# Altium footprint library Global Library.PcbLib: 97 footprints (part 1 of 7)
Each footprint in its own frame and in the unit in brackets; x right, y up, seen from the top. Pads: shape width x height; smd on the part's side, far side on the other; paste and mask are expansions set on the pad; w line width, h text height; cw(c..) or ccw(c..) is an arc to the next point about the centre after c.
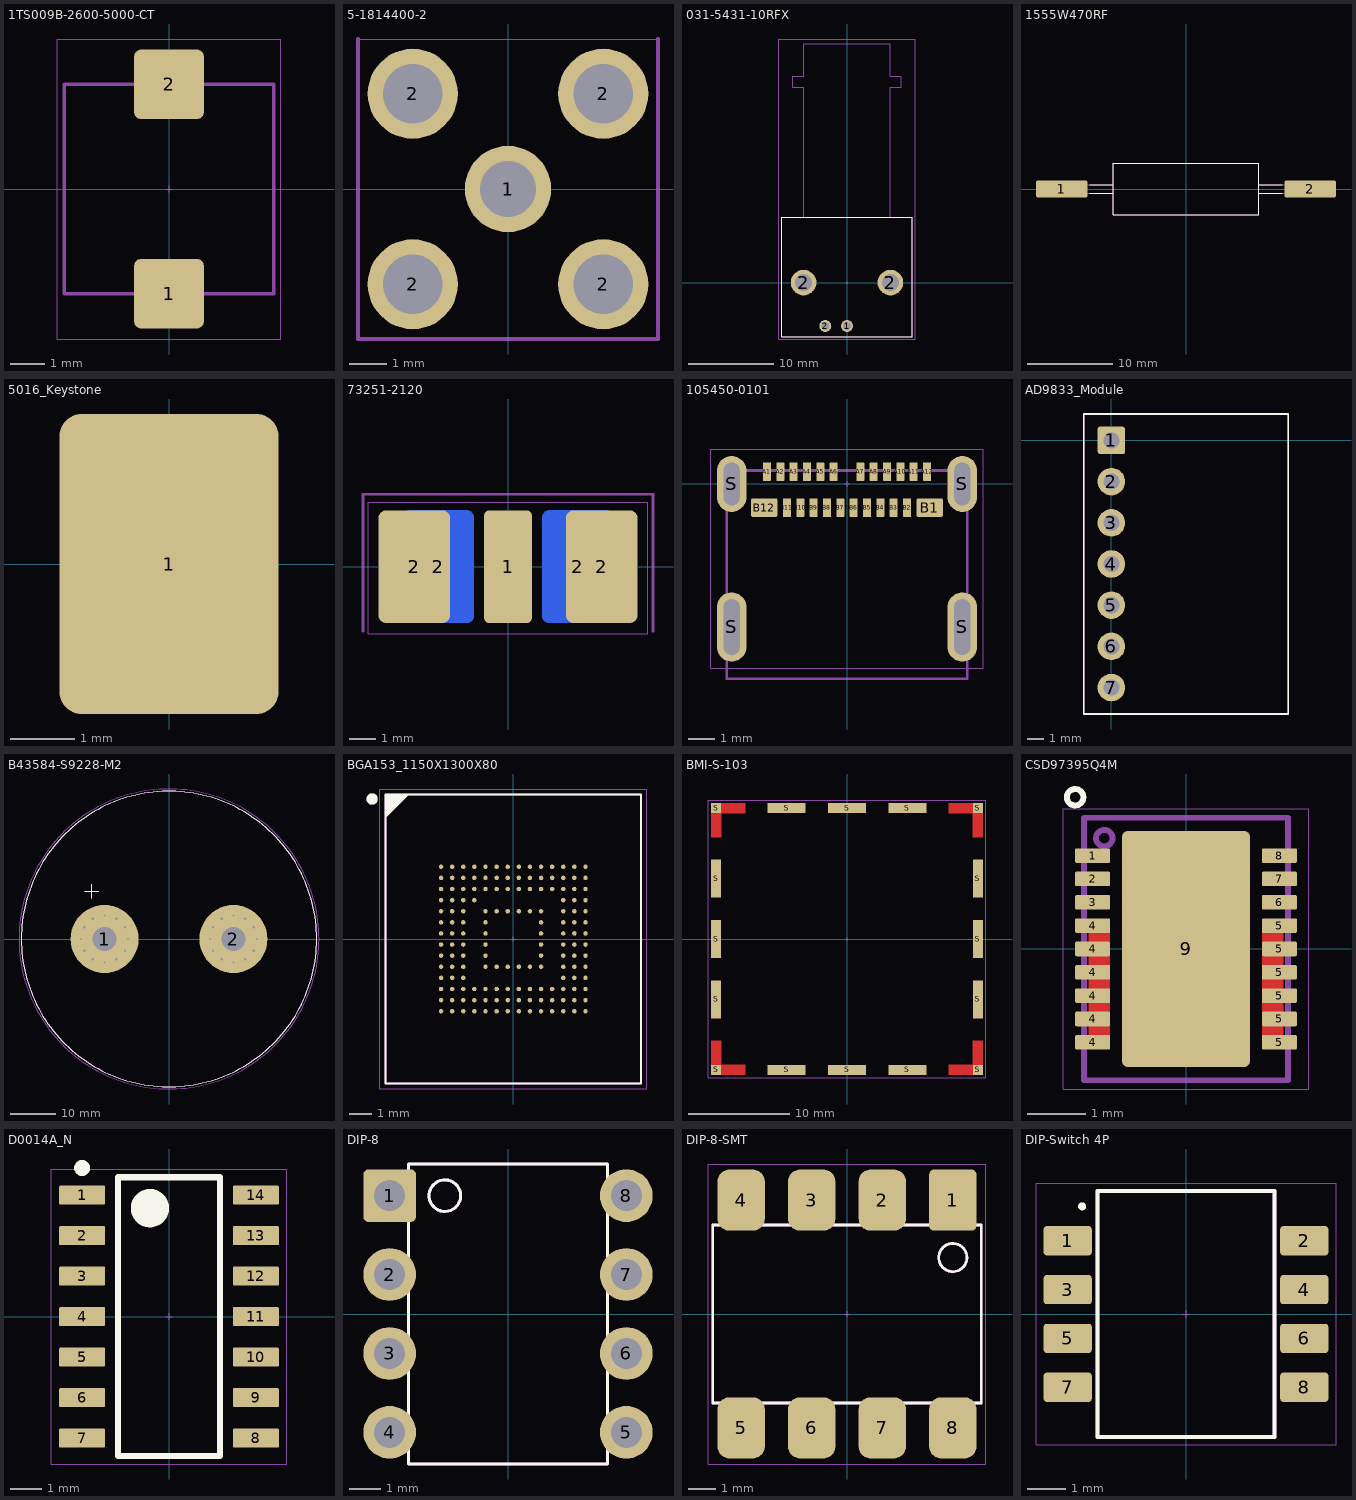
[diagram p0: the footprints below, top view; thin cyan lines are the x and y axes]

## 1TS009B-2600-5000-CT [mm] "Button Tactile 6x6"
height 5
pads (2):
  rrect20% 2x2 smd: 1(0,-3) 2(0,3)
Top Courtyard:
  lines w0.01: -0.1,0 0.1,0 ; 0,-0.1 0,0.1 ; -3.2,-4.3 -3.2,4.3 3.2,4.3 3.2,-4.3 -3.2,-4.3
Top Assembly:
  lines w0.1: -3,-3 -3,3 3,3 3,-3 -3,-3
Top Assy SMT:
  lines w0.1: -3,-3 -3,3 3,3 3,-3 -3,-3
  text ".Designator" at -3.259,-3.081 h1
3D body "1TS009B-XXX0-5000.stp": height 5, standoff 0, extent -3,-3.3 3,3.3

## 5-1814400-2 [mm] "SMA Connector"
pads (5):
  round 2.3 hole 1.5: 1(0,0)
  round 2.4 hole 1.6: 2(-2.54,-2.54) 2(-2.54,2.54) 2(2.54,-2.54) 2(2.54,2.54)
Top Courtyard:
  lines w0.01: -0.1,0 0.1,0 ; 0,-0.1 0,0.1 ; -4,-4 4,-4 4,4 -4,4 -4,-4
Top Assembly:
  lines w0.1: -4,4 -4,-4 4,-4 4,4
Top Assy SMT:
  lines w0.1: -4,4 -4,-4 4,-4 4,4
Top Assy THT:
  text ".Designator" at -4.379,-4.042 h2
3D body "TE_5-1814400-1.STEP": height 10.43, standoff -2.8, extent -3.163,-3.15 3.163,11.05

## 031-5431-10RFX [mm] "CONN BNC"
height 15.6
pads (4):
  round 1.4 hole 0.89: 1(0,-5.08) 2(-2.54,-5.08)
  round 3 hole 2: 2(-5.08,0) 2(5.08,0)
Top Overlay:
  lines w0.1: -7.62,-6.35 7.62,-6.35 7.62,7.62 -7.62,7.62 -7.62,-6.35
Top Courtyard:
  lines w0.01: -0.1,0 0.1,0 ; 0,-0.1 0,0.1 ; -8,-6.6 8,-6.6 8,28.5 -8,28.5 -8,-6.6
Top Assembly:
  lines w0.1: -5.08,7.62 -5.08,22.86 -6.35,22.86 -6.35,24.13 -5.08,24.13 -5.08,27.94 5.08,27.94 5.08,24.13 6.35,24.13 6.35,22.86 5.08,22.86 5.08,7.62 ; -7.62,-6.35 7.62,-6.35 7.62,7.62 -7.62,7.62 -7.62,-6.35
Top Assy SMT:
  lines w0.1: -5.08,7.62 -5.08,22.86 -6.35,22.86 -6.35,24.13 -5.08,24.13 -5.08,27.94 5.08,27.94 5.08,24.13 6.35,24.13 6.35,22.86 5.08,22.86 5.08,7.62 ; -7.62,-6.35 7.62,-6.35 7.62,7.62 -7.62,7.62 -7.62,-6.35
Top Assy THT:
  text ".Designator" at -8.479,-5.342 h2
3D body "31-5431-10RFX.stp": height 16.71, standoff -4.08, extent -7.9,-6.35 7.9,28.35

## 1555W470RF [mm]
height 6
pads (2):
  rrect20% 6x2 smd: 1(-14.5,0) 2(14.5,0)
Top Overlay:
  lines w0.1: -11.25,-0.5 -8.5,-0.5 ; -11.25,0.5 -8.5,0.5 ; 8.5,-0.5 11.25,-0.5 ; 8.5,0.5 11.25,0.5 ; -8.5,-3 8.5,-3 8.5,3 -8.5,3 -8.5,-3
Top Assembly:
  lines w0.1: -8.5,-0.5 -17,-0.5 -17,0.5 -8.5,0.5 ; 8.5,-0.5 17,-0.5 17,0.5 8.5,0.5 ; -8.5,-3 -8.5,3 8.5,3 8.5,-3 -8.5,-3
Top Assy SMT:
  lines w0.1: -8.5,-0.5 -17,-0.5 -17,0.5 -8.5,0.5 ; 8.5,-0.5 17,-0.5 17,0.5 8.5,0.5 ; -8.5,-3 -8.5,3 8.5,3 8.5,-3 -8.5,-3
  text ".Designator" at -3.647,-0.339 h1.5
3D body: height 6, standoff 0, extent -8.5,-2.948 8.5,3.052

## 5016_Keystone [mm] "Probe Clip"
pads (1):
  rrect20% 3.43x4.7 smd: 1(0,0)
3D body "5016.step": height 2.29, standoff 0, extent -1.422,-1.905 1.422,1.905

## 73251-2120 [mm] "SMA Connector"
pads (5):
  rrect20% 1.78x4.19 smd: 1(0,0)
  rrect20% 2.665x4.19 smd: 2(-3.492,0) 2(3.492,0)
  rrect20% 2.665x4.19 smd far side: 2(-2.6,0) 2(2.6,0)
Top Courtyard:
  lines w0.01: -0.1,0 0.1,0 ; 0,-0.1 0,0.1 ; -5.2,-2.5 -5.2,2.4 5.2,2.4 5.2,-2.5 -5.2,-2.5
Top Assembly:
  lines w0.1: -5.4,-2.4 -5.4,2.7 5.4,2.7 5.4,-2.4
Top Assy SMT:
  lines w0.1: -5.4,-2.4 -5.4,2.7 5.4,2.7 5.4,-2.4
Top Assy THT:
  text ".Designator" at -4.379,-4.042 h2
3D body "sma-3.step": height 3.9, standoff -2.5, extent -3.2,-0.8 3.2,17.5

## 105450-0101 [mm] "USB-C Connector"
pads (28):
  rrect20% 0.3x0.7 smd: A1(-3,0.46) A2(-2.5,0.46) A3(-2,0.46) A4(-1.5,0.46) A5(-1,0.46) A6(-0.5,0.46) A7(0.5,0.46) A8(1,0.46) A9(1.5,0.46) A10(2,0.46) A11(2.5,0.46) A12(3,0.46) B2(2.25,-0.89) B3(1.75,-0.89) B4(1.25,-0.89) B5(0.75,-0.89) B6(0.25,-0.89) B7(-0.25,-0.89) B8(-0.75,-0.89) B9(-1.25,-0.89) B10(-1.75,-0.89) B11(-2.25,-0.89)
  rrect20% 1x0.7 smd mask+0.15: B1(3.1,-0.89) B12(-3.1,-0.89)
  oval 1.1x2.6 hole 0.6 slot 2.1 at 90 deg: S(-4.32,-5.36) S(4.32,-5.36)
  oval 1.1x2.1 hole 0.6 slot 1.6 at 90 deg mask+0.102: S(-4.32,0) S(4.32,0)
Top Courtyard:
  lines w0.01: -0.1,0 0.1,0 ; 0,-0.1 0,0.1 ; -5.1,-6.9 -5.1,1.3 5.1,1.3 5.1,-6.9 -5.1,-6.9
Top Assembly:
  lines w0.1: -4.5,-7.3 -4.5,0.5 4.5,0.5 4.5,-7.3 -4.5,-7.3
Top Assy SMT:
  lines w0.1: -4.5,-7.3 -4.5,0.5 4.5,0.5 4.5,-7.3 -4.5,-7.3
Top Assy THT:
  text ".Designator" at -5.3,-6.9 h1.5
3D body "1054500101.stp": height 3.18, standoff -0.78, extent -4.47,-7.3 4.47,0.6

## AD9833_Module [mm]
pads (7):
  rrect20% 1.7x1.7 hole 1: 1(0,0)
  round 1.7 hole 1: 2(0,-2.54) 3(0,-5.08) 4(0,-7.62) 5(0,-10.16) 6(0,-12.7) 7(0,-15.24)
Top Overlay:
  lines w0.1: -1.7,-16.87 10.9,-16.87 10.9,1.63 -1.7,1.63 -1.7,-16.87
Top Assembly:
  lines w0.1: -1.7,-16.87 -1.7,1.63 10.9,1.63 10.9,-16.87 -1.7,-16.87
Top Assy THT:
  lines w0.1: -1.7,-16.87 10.9,-16.87 10.9,1.63 -1.7,1.63 -1.7,-16.87
  text ".Designator" at -2.279,-17.042 h2

## B43584-S9228-M2 [mm] "CAP Alu 400V 2200uF"
pads (2):
  round 15 hole 5.3: 1(-14.175,0) 2(14.175,0)
via 11.588,-4.482 diameter 1 hole 0.5
via 9.693,-2.588 diameter 1 hole 0.5
via 9.693,2.588 diameter 1 hole 0.5
via 11.588,4.482 diameter 1 hole 0.5
via 16.763,4.482 diameter 1 hole 0.5
via 18.657,2.588 diameter 1 hole 0.5
via 18.657,-2.588 diameter 1 hole 0.5
via 16.763,-4.482 diameter 1 hole 0.5
via 19.35,0 diameter 1 hole 0.5
via 14.175,5.175 diameter 1 hole 0.5
via 9,0 diameter 1 hole 0.5
via 14.175,-5.175 diameter 1 hole 0.5
via -16.763,-4.482 diameter 1 hole 0.5
via -18.657,-2.588 diameter 1 hole 0.5
via -18.657,2.588 diameter 1 hole 0.5
via -16.763,4.482 diameter 1 hole 0.5
via -11.588,4.482 diameter 1 hole 0.5
via -9.693,2.588 diameter 1 hole 0.5
via -9.693,-2.588 diameter 1 hole 0.5
via -11.588,-4.482 diameter 1 hole 0.5
via -9,0 diameter 1 hole 0.5
via -14.175,5.175 diameter 1 hole 0.5
via -19.35,0 diameter 1 hole 0.5
via -14.175,-5.175 diameter 1 hole 0.5
Top Overlay:
  circle w0.1: c0,0 r32.5
  lines w0.1: -18.5,10.5 -15.5,10.5 ; -17,9 -17,12
Top Courtyard:
  circle w0.01: c0,0 r33
  lines w0.01: -0.1,0 0.1,0 ; 0,-0.1 0,0.1
Top Assembly:
  circle w0.1: c0,0 r32.5
  lines w0.1: -18.5,10.5 -15.5,10.5 ; -17,9 -17,12
3D body "Kondensator_400V_2200uF.stp": height 125.2, standoff 0, extent -32.5,-32.5 32.5,32.5

## BGA153_1150X1300X80 [mm] "BGA, 153-Leads, Body 11.50x13.00mmx0.80mm, Pitch 0.50mm"
height 0.8
pads (153):
  round 0.2 smd: A1(-3.25,3.25) A2(-2.75,3.25) A3(-2.25,3.25) A4(-1.75,3.25) A5(-1.25,3.25) A6(-0.75,3.25) A7(-0.25,3.25) A8(0.25,3.25) A9(0.75,3.25) A10(1.25,3.25) A11(1.75,3.25) A12(2.25,3.25) A13(2.75,3.25) A14(3.25,3.25) B1(-3.25,2.75) B2(-2.75,2.75) B3(-2.25,2.75) B4(-1.75,2.75) B5(-1.25,2.75) B6(-0.75,2.75) B7(-0.25,2.75) B8(0.25,2.75) B9(0.75,2.75) B10(1.25,2.75) B11(1.75,2.75) B12(2.25,2.75) B13(2.75,2.75) B14(3.25,2.75) C1(-3.25,2.25) C2(-2.75,2.25) C3(-2.25,2.25) C4(-1.75,2.25) C5(-1.25,2.25) C6(-0.75,2.25) C7(-0.25,2.25) C8(0.25,2.25) C9(0.75,2.25) C10(1.25,2.25) C11(1.75,2.25) C12(2.25,2.25) C13(2.75,2.25) C14(3.25,2.25) D1(-3.25,1.75) D2(-2.75,1.75) D3(-2.25,1.75) D4(-1.75,1.75) D12(2.25,1.75) D13(2.75,1.75) D14(3.25,1.75) E1(-3.25,1.25) E2(-2.75,1.25) E3(-2.25,1.25) E5(-1.25,1.25) E6(-0.75,1.25) E7(-0.25,1.25) E8(0.25,1.25) E9(0.75,1.25) E10(1.25,1.25) E12(2.25,1.25) E13(2.75,1.25) E14(3.25,1.25) F1(-3.25,0.75) F2(-2.75,0.75) F3(-2.25,0.75) F5(-1.25,0.75) F10(1.25,0.75) F12(2.25,0.75) F13(2.75,0.75) F14(3.25,0.75) G1(-3.25,0.25) G2(-2.75,0.25) G3(-2.25,0.25) G5(-1.25,0.25) G10(1.25,0.25) G12(2.25,0.25) G13(2.75,0.25) G14(3.25,0.25) H1(-3.25,-0.25) H2(-2.75,-0.25) H3(-2.25,-0.25) H5(-1.25,-0.25) H10(1.25,-0.25) H12(2.25,-0.25) H13(2.75,-0.25) H14(3.25,-0.25) J1(-3.25,-0.75) J2(-2.75,-0.75) J3(-2.25,-0.75) J5(-1.25,-0.75) J10(1.25,-0.75) J12(2.25,-0.75) J13(2.75,-0.75) J14(3.25,-0.75) K1(-3.25,-1.25) K2(-2.75,-1.25) K3(-2.25,-1.25) K5(-1.25,-1.25) K6(-0.75,-1.25) K7(-0.25,-1.25) K8(0.25,-1.25) K9(0.75,-1.25) K10(1.25,-1.25) K12(2.25,-1.25) K13(2.75,-1.25) K14(3.25,-1.25) L1(-3.25,-1.75) L2(-2.75,-1.75) L3(-2.25,-1.75) L12(2.25,-1.75) L13(2.75,-1.75) L14(3.25,-1.75) M1(-3.25,-2.25) M2(-2.75,-2.25) M3(-2.25,-2.25) M4(-1.75,-2.25) M5(-1.25,-2.25) M6(-0.75,-2.25) M7(-0.25,-2.25) M8(0.25,-2.25) M9(0.75,-2.25) M10(1.25,-2.25) M11(1.75,-2.25) M12(2.25,-2.25) M13(2.75,-2.25) M14(3.25,-2.25) N1(-3.25,-2.75) N2(-2.75,-2.75) N3(-2.25,-2.75) N4(-1.75,-2.75) N5(-1.25,-2.75) N6(-0.75,-2.75) N7(-0.25,-2.75) N8(0.25,-2.75) N9(0.75,-2.75) N10(1.25,-2.75) N11(1.75,-2.75) N12(2.25,-2.75) N13(2.75,-2.75) N14(3.25,-2.75) P1(-3.25,-3.25) P2(-2.75,-3.25) P3(-2.25,-3.25) P4(-1.75,-3.25) P5(-1.25,-3.25) P6(-0.75,-3.25) P7(-0.25,-3.25) P8(0.25,-3.25) P9(0.75,-3.25) P10(1.25,-3.25) P11(1.75,-3.25) P12(2.25,-3.25) P13(2.75,-3.25) P14(3.25,-3.25)
Top Overlay:
  circle w0.25: c-6.35,6.3 r0.125
  region: -4.75,6.5 -5.75,5.5 -5.75,6.5
  lines w0.1: -5.75,5.5 -4.75,6.5 ; -5.75,-6.5 5.75,-6.5 5.75,6.5 -5.75,6.5 -5.75,-6.5
Top Courtyard:
  lines w0.01: -0.1,0 0.1,0 ; 0,-0.1 0,0.1 ; -6,-6.75 6,-6.75 6,6.75 -6,6.75 -6,-6.75
Top Assembly:
  circle w0.25: c-6.35,6.3 r0.125
  lines w0.1: -5.75,-6.5 5.75,-6.5 5.75,6.5 -5.75,6.5 -5.75,-6.5
Top Assy SMT:
  circle w0.25: c-6.35,6.3 r0.125
  lines w0.1: -5.75,-6.5 5.75,-6.5 5.75,6.5 -5.75,6.5 -5.75,-6.5
  text ".Designator" at -5.9,7.1 h1
3D body "BGA153_1150X1300X80.step": height 0.8, standoff 0, extent -5.75,-6.5 5.75,6.5

## BMI-S-103 [mm] "EMI Shield"
pads (16):
  rect 1x1 smd: S(-13,-13) S(-13,13) S(13,-13) S(13,13)
  rect 1x3.79 smd: S(-13,-6) S(-13,0) S(-13,6) S(13,-6) S(13,0) S(13,6)
  rect 3.79x1 smd: S(-6,-13) S(-6,13) S(0,-13) S(0,13) S(6,-13) S(6,13)
Top Layer:
  region: -13.5,13.5 -10.1,13.5 -10.1,12.5 -12.5,12.5 -12.5,10.1 -13.5,10.1
  region: -13.5,-13.5 -13.5,-10.1 -12.5,-10.1 -12.5,-12.5 -10.1,-12.5 -10.1,-13.5
  region: 13.5,-13.5 10.1,-13.5 10.1,-12.5 12.5,-12.5 12.5,-10.1 13.5,-10.1
  region: 13.5,13.5 13.5,10.1 12.5,10.1 12.5,12.5 10.1,12.5 10.1,13.5
Top Courtyard:
  lines w0.01: -0.1,0 0.1,0 ; 0,-0.1 0,0.1 ; -13.8,-13.8 -13.8,13.8 13.8,13.8 13.8,-13.8 -13.8,-13.8
3D body "bmi-s-103-stp-file.STP": height 5.1, standoff 0.02, extent -13.105,-13.105 13.105,13.105

## CSD97395Q4M [mm]
height 1
pads (19):
  rrect20% 0.6x0.25 smd mask+0.05: 1(-1.6,1.6) 2(-1.6,1.2) 3(-1.6,0.8) 4(-1.6,-1.6) 4(-1.6,-1.2) 4(-1.6,-0.8) 4(-1.6,-0.4) 4(-1.6,0) 4(-1.6,0.4) 5(1.6,-1.6) 5(1.6,-1.2) 5(1.6,-0.8) 5(1.6,-0.4) 5(1.6,0) 5(1.6,0.4) 6(1.6,0.8) 7(1.6,1.2) 8(1.6,1.6)
  rrect10% 2.2x4.05 smd paste-100 mask+0.05: 9(0,0)
Top Layer:
  region: -1.3,0.4 -1.675,0.4 -1.675,-1.6 -1.3,-1.6
  rectangle: 1.3,-1.6 1.675,0.4
Top Overlay:
  circle w0.1: c-1.9,2.6 r0.141
Top Paste:
  region: -0.15,-1.188 -1,-1.188 -1,-1.926 -0.15,-1.926
  rectangle: 0.15,-1.926 1,-1.188
  rectangle: 0.15,1.188 1,1.926
  region: -0.15,1.926 -1,1.926 -1,1.188 -0.15,1.188
  rectangle: 0.15,0.15 1,0.888
  region: -0.15,0.888 -1,0.888 -1,0.15 -0.15,0.15
  rectangle: 0.15,-0.888 1,-0.15
  region: -0.15,-0.15 -1,-0.15 -1,-0.888 -0.15,-0.888
Top Courtyard:
  lines w0.01: -0.1,0 0.1,0 ; 0,-0.1 0,0.1 ; -2.1,-2.4 2.1,-2.4 2.1,2.4 -2.1,2.4 -2.1,-2.4
Top Assembly:
  circle w0.1: c-1.4,1.9 r0.141
  lines w0.1: -1.75,-2.25 1.75,-2.25 1.75,2.25 -1.75,2.25 -1.75,-2.25
Top Assy SMT:
  circle w0.1: c-1.4,1.9 r0.141
  lines w0.1: -1.75,-2.25 1.75,-2.25 1.75,2.25 -1.75,2.25 -1.75,-2.25
  text ".Designator" at -1.937,-0.18 h0.8
3D body "CSD97395Q4M.step": height 1, standoff 0, extent -1.75,-2.25 1.75,2.25

## D0014A_N [mm] "SOIC, 14-Leads, Body 8.75x4mm, Pitch 1.27mm, IPC Medium Density"
height 1.75
pads (14):
  rrect17% 1.45x0.6 smd: 1(-2.725,3.81) 2(-2.725,2.54) 3(-2.725,1.27) 4(-2.725,0) 5(-2.725,-1.27) 6(-2.725,-2.54) 7(-2.725,-3.81) 8(2.725,-3.81) 9(2.725,-2.54) 10(2.725,-1.27) 11(2.725,0) 12(2.725,1.27) 13(2.725,2.54) 14(2.725,3.81)
Top Overlay:
  circle w0.6: c-0.6,3.4 r0.3
  circle w0.25: c-2.725,4.66 r0.125
  lines w0.2: -1.6,-4.375 1.6,-4.375 1.6,4.375 -1.6,4.375 -1.6,-4.375
Top Courtyard:
  lines w0.01: -0.1,0 0.1,0 ; 0,-0.1 0,0.1 ; -3.7,-4.625 3.7,-4.625 3.7,4.625 -3.7,4.625 -3.7,-4.625
Top Assy SMT:
  text ".Designator" at -2.2,4.8 h0.8
3D body "SOIC-14akaD0014AakaM14A.stp": height 1.59, standoff -0.01, extent -3.023,-4.318 3.022,4.318

## DIP-8 [mm]
pads (8):
  rrect20% 1.7x1.7 hole 1: 1(-3.81,3.81)
  round 1.7 hole 1: 2(-3.81,1.27) 3(-3.81,-1.27) 4(-3.81,-3.81) 5(3.81,-3.81) 6(3.81,-1.27) 7(3.81,1.27) 8(3.81,3.81)
Top Overlay:
  circle w0.1: c-2.032,3.81 r0.508
  lines w0.1: -3.2,-4.83 3.2,-4.83 3.2,4.83 -3.2,4.83 -3.2,-4.83
Top Assembly:
  circle w0.1: c-2.032,3.81 r0.508
  lines w0.1: -3.2,-4.83 3.2,-4.83 3.2,4.83 -3.2,4.83 -3.2,-4.83
Top Assy THT:
  circle w0.1: c-2.032,3.81 r0.508
  lines w0.1: -3.2,-4.83 3.2,-4.83 3.2,4.83 -3.2,4.83 -3.2,-4.83
  text ".Designator" at 2.221,-4.642 h2

## DIP-8-SMT [mm]
pads (8):
  rrect20% 1.7x2.2 smd: 1(3.81,4.1)
  rrect50% 1.7x2.2 smd: 2(1.27,4.1) 3(-1.27,4.1) 4(-3.81,4.1) 5(-3.81,-4.1) 6(-1.27,-4.1) 7(1.27,-4.1) 8(3.81,-4.1)
Top Overlay:
  circle w0.1: c3.81,2.032 r0.508
  lines w0.1: -4.83,-3.2 -4.83,3.2 4.83,3.2 4.83,-3.2 -4.83,-3.2
Top Courtyard:
  lines w0.01: -0.1,0 0.1,0 ; 0,-0.1 0,0.1 ; -5,-5.4 5,-5.4 5,5.4 -5,5.4 -5,-5.4
Top Assembly:
  circle w0.1: c3.81,2.032 r0.508
  lines w0.1: -4.83,-3.2 -4.83,3.2 4.83,3.2 4.83,-3.2 -4.83,-3.2
Top Assy THT:
  circle w0.1: c3.81,2.032 r0.508
  lines w0.1: -4.83,-3.2 4.83,-3.2 4.83,3.2 -4.83,3.2 -4.83,-3.2
  text ".Designator" at -4.642,-2.221 h2
3D body "SMD DIP 8 (op7) vishay.STEP": height 4.25, standoff 0, extent -4.875,-5.025 4.875,5.025

## DIP-Switch 4P [mm] "DIP Switch"
pads (8):
  rrect20% 1.25x0.76 smd: 1(-3.075,1.905) 2(3.075,1.905) 3(-3.075,0.635) 4(3.075,0.635) 5(-3.075,-0.635) 6(3.075,-0.635) 7(-3.075,-1.905) 8(3.075,-1.905)
Top Overlay:
  circle w0.1: c-2.7,2.8 r0.054
  lines w0.1: -2.3,-3.2 2.3,-3.2 2.3,3.2 -2.3,3.2 -2.3,-3.2
Top Courtyard:
  lines w0.01: -0.1,0 0.1,0 ; 0,-0.1 0,0.1 ; -3.9,-3.4 -3.9,3.4 3.9,3.4 3.9,-3.4 -3.9,-3.4
Top Assembly:
  lines w0.1: -2.3,-3.2 -2.3,3.2 2.3,3.2 2.3,-3.2 -2.3,-3.2
Top Assy SMT:
  lines w0.1: -2.3,-3.2 -2.3,3.2 2.3,3.2 2.3,-3.2 -2.3,-3.2
  text ".Designator" at -3.9,3.5 h1
3D body "A6H_4101.step": height 1.55, standoff 0, extent -3.35,-3.16 3.35,3.15